# Altium footprint library WR-TBL_Pluggable PCB Header.PcbLib: 719 footprints (part 36 of 45)
Each footprint in its own frame and in the unit in brackets; x right, y up, seen from the top. Pads: shape width x height; smd on the part's side, far side on the other; paste and mask are expansions set on the pad; w line width, h text height; cw(c..) or ccw(c..) is an arc to the next point about the centre after c.
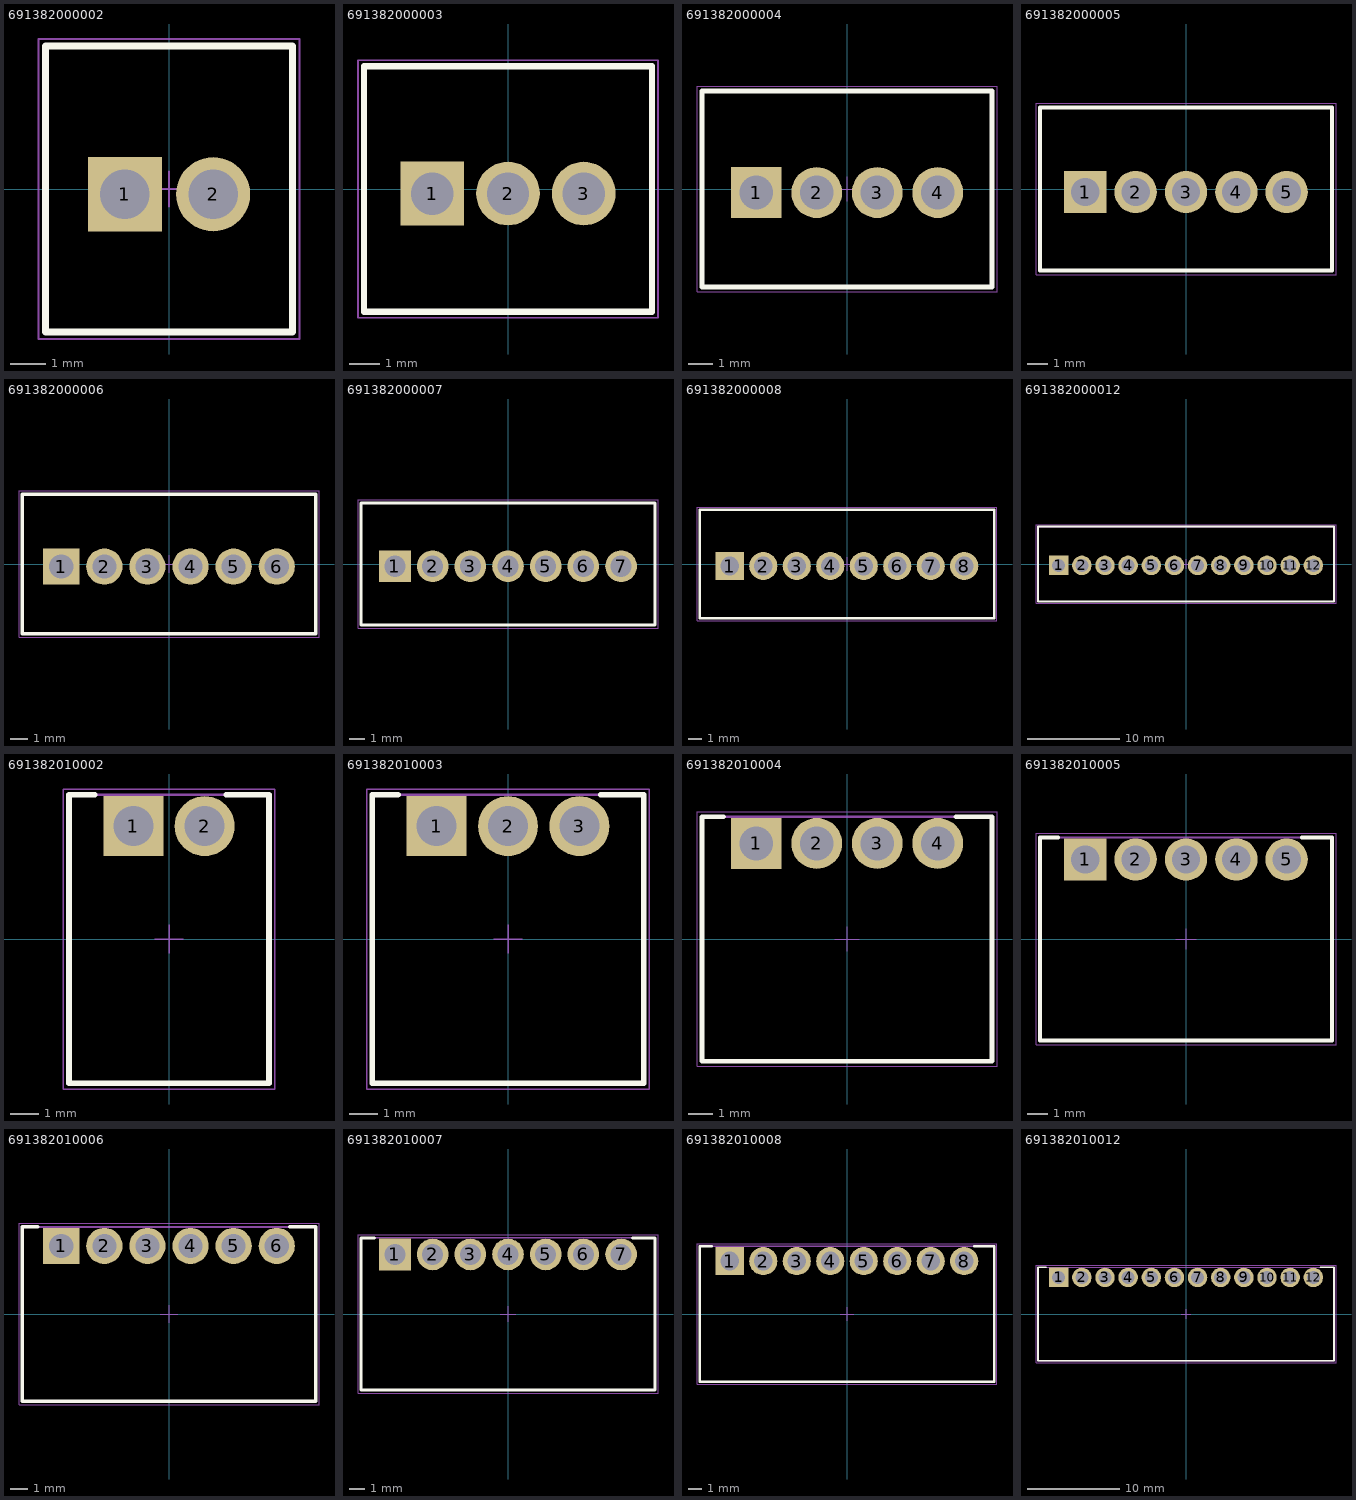
[diagram p35: the footprints below, top view; thin cyan lines are the x and y axes]

## 691382000002 [mm] "Vertical PCB Header, pitch 2.5mm, 02p"
height 10.1
pads (2):
  rect 2.1x2.1 hole 1.4: 1(-1.25,-0.15)
  round 2.1 hole 1.4: 2(1.25,-0.15)
Top Overlay:
  lines w0.2: -3.5,-4.05 3.5,-4.05 3.5,4.05 -3.5,4.05 -3.5,-4.05
Mechanical 13:
  lines w0.1: -3.5,-4.05 -3.5,4.05 3.5,4.05 3.5,-4.05 -3.5,-4.05
Mechanical 15:
  lines w0.05: -0.5,0 0.5,0 ; 0,-0.5 0,0.5 ; -3.7,-4.25 3.7,-4.25 3.7,4.25 -3.7,4.25 -3.7,-4.25
3D body "691382000002.stp": height 10.14, standoff -3.46, extent -3.5,-4.05 3.5,4.05

## 691382000003 [mm] "Vertical PCB Header, pitch 2.5mm, 03p"
height 10.1
pads (3):
  rect 2.1x2.1 hole 1.4: 1(-2.5,-0.15)
  round 2.1 hole 1.4: 2(0,-0.15) 3(2.5,-0.15)
Top Overlay:
  lines w0.2: -4.75,-4.05 -4.75,4.05 4.75,4.05 4.75,-4.05 -4.75,-4.05
Mechanical 13:
  lines w0.1: -4.75,-4.05 4.75,-4.05 4.75,4.05 -4.75,4.05 -4.75,-4.05
Mechanical 15:
  lines w0.05: -0.5,0 0.5,0 ; 0,-0.5 0,0.5 ; -4.95,-4.25 -4.95,4.25 4.95,4.25 4.95,-4.25 -4.95,-4.25
3D body "691382000003.stp": height 10.14, standoff -3.46, extent -4.75,-4.05 4.75,4.05

## 691382000004 [mm] "Vertical PCB Header, pitch 2.5mm, 04p"
height 10.1
pads (4):
  rect 2.1x2.1 hole 1.4: 1(-3.75,-0.15)
  round 2.1 hole 1.4: 2(-1.25,-0.15) 3(1.25,-0.15) 4(3.75,-0.15)
Top Overlay:
  lines w0.2: -6,-4.05 6,-4.05 6,4.05 -6,4.05 -6,-4.05
Mechanical 13:
  lines w0.1: -6,-4.05 -6,4.05 6,4.05 6,-4.05 -6,-4.05
Mechanical 15:
  lines w0.05: -0.5,0 0.5,0 ; 0,-0.5 0,0.5 ; -6.2,-4.25 6.2,-4.25 6.2,4.25 -6.2,4.25 -6.2,-4.25
3D body "691382000004.stp": height 10.14, standoff -3.46, extent -6,-4.05 6,4.05

## 691382000005 [mm] "Vertical PCB Header, pitch 2.5mm, 05p"
height 10.1
pads (5):
  rect 2.1x2.1 hole 1.4: 1(-5,-0.15)
  round 2.1 hole 1.4: 2(-2.5,-0.15) 3(0,-0.15) 4(2.5,-0.15) 5(5,-0.15)
Top Overlay:
  lines w0.2: -7.25,-4.05 7.25,-4.05 7.25,4.05 -7.25,4.05 -7.25,-4.05
Mechanical 13:
  lines w0.1: -7.25,-4.05 -7.25,4.05 7.25,4.05 7.25,-4.05 -7.25,-4.05
Mechanical 15:
  lines w0.05: -0.5,0 0.5,0 ; 0,-0.5 0,0.5 ; -7.45,-4.25 7.45,-4.25 7.45,4.25 -7.45,4.25 -7.45,-4.25
3D body "691382000005.stp": height 10.14, standoff -3.46, extent -7.25,-4.05 7.25,4.05

## 691382000006 [mm] "Vertical PCB Header, pitch 2.5mm, 06p"
height 10.1
pads (6):
  rect 2.1x2.1 hole 1.4: 1(-6.25,-0.15)
  round 2.1 hole 1.4: 2(-3.75,-0.15) 3(-1.25,-0.15) 4(1.25,-0.15) 5(3.75,-0.15) 6(6.25,-0.15)
Top Overlay:
  lines w0.2: -8.5,-4.05 -8.5,4.05 8.5,4.05 8.5,-4.05 -8.5,-4.05
Mechanical 13:
  lines w0.1: -8.5,-4.05 8.5,-4.05 8.5,4.05 -8.5,4.05 -8.5,-4.05
Mechanical 15:
  lines w0.05: -0.5,0 0.5,0 ; 0,-0.5 0,0.5 ; -8.7,-4.25 -8.7,4.25 8.7,4.25 8.7,-4.25 -8.7,-4.25
3D body "691382000006.stp": height 10.14, standoff -3.46, extent -8.5,-4.05 8.5,4.05

## 691382000007 [mm] "Vertical PCB Header, pitch 2.5mm, 07p"
height 10.1
pads (7):
  rect 2.1x2.1 hole 1.4: 1(-7.5,-0.15)
  round 2.1 hole 1.4: 2(-5,-0.15) 3(-2.5,-0.15) 4(0,-0.15) 5(2.5,-0.15) 6(5,-0.15) 7(7.5,-0.15)
Top Overlay:
  lines w0.2: -9.75,-4.05 9.75,-4.05 9.75,4.05 -9.75,4.05 -9.75,-4.05
Mechanical 13:
  lines w0.1: -9.75,-4.05 -9.75,4.05 9.75,4.05 9.75,-4.05 -9.75,-4.05
Mechanical 15:
  lines w0.05: -0.5,0 0.5,0 ; 0,-0.5 0,0.5 ; -9.95,-4.25 9.95,-4.25 9.95,4.25 -9.95,4.25 -9.95,-4.25
3D body "691382000007.stp": height 10.14, standoff -3.46, extent -9.75,-4.05 9.75,4.05

## 691382000008 [mm] "Vertical PCB Header, pitch 2.5mm, 08p"
height 10.1
pads (8):
  rect 2.1x2.1 hole 1.4: 1(-8.75,-0.15)
  round 2.1 hole 1.4: 2(-6.25,-0.15) 3(-3.75,-0.15) 4(-1.25,-0.15) 5(1.25,-0.15) 6(3.75,-0.15) 7(6.25,-0.15) 8(8.75,-0.15)
Top Overlay:
  lines w0.2: -11,-4.05 -11,4.05 11,4.05 11,-4.05 -11,-4.05
Mechanical 13:
  lines w0.1: -11,-4.05 11,-4.05 11,4.05 -11,4.05 -11,-4.05
Mechanical 15:
  lines w0.05: -0.5,0 0.5,0 ; 0,-0.5 0,0.5 ; -11.2,-4.25 -11.2,4.25 11.2,4.25 11.2,-4.25 -11.2,-4.25
3D body "691382000008.stp": height 10.14, standoff -3.46, extent -11,-4.05 11,4.05

## 691382000012 [mm] "Vertical PCB Header, pitch 2.5mm, 12p"
height 10.1
pads (12):
  rect 2.1x2.1 hole 1.4: 1(-13.75,-0.15)
  round 2.1 hole 1.4: 2(-11.25,-0.15) 3(-8.75,-0.15) 4(-6.25,-0.15) 5(-3.75,-0.15) 6(-1.25,-0.15) 7(1.25,-0.15) 8(3.75,-0.15) 9(6.25,-0.15) 10(8.75,-0.15) 11(11.25,-0.15) 12(13.75,-0.15)
Top Overlay:
  lines w0.2: -16,-4.05 16,-4.05 16,4.05 -16,4.05 -16,-4.05
Mechanical 13:
  lines w0.1: -16,-4.05 -16,4.05 16,4.05 16,-4.05 -16,-4.05
Mechanical 15:
  lines w0.05: -0.5,0 0.5,0 ; 0,-0.5 0,0.5 ; -16.2,-4.25 16.2,-4.25 16.2,4.25 -16.2,4.25 -16.2,-4.25
3D body "691382000012.stp": height 10.14, standoff -3.46, extent -16,-4.05 16,4.05

## 691382010002 [mm] "Horizontal PCB Header, pitch 2.5mm, 02p"
height 8.1
pads (2):
  rect 2.1x2.1 hole 1.4: 1(-1.25,3.95)
  round 2.1 hole 1.4: 2(1.25,3.95)
Top Overlay:
  lines w0.2: -2.6,5.05 -3.5,5.05 -3.5,-5.05 3.5,-5.05 3.5,5.05 2,5.05
Mechanical 13:
  lines w0.1: -3.5,-5.05 3.5,-5.05 3.5,5.05 -3.5,5.05 -3.5,-5.05
Mechanical 15:
  lines w0.05: -0.5,0 0.5,0 ; 0,-0.5 0,0.5 ; -3.7,-5.25 3.7,-5.25 3.7,5.25 -3.7,5.25 -3.7,-5.25
3D body "691382010002.stp": height 8.15, standoff -3.45, extent -3.5,-5.05 3.5,5.05

## 691382010003 [mm] "Horizontal PCB Header, pitch 2.5mm, 03p"
height 8.1
pads (3):
  rect 2.1x2.1 hole 1.4: 1(-2.5,3.95)
  round 2.1 hole 1.4: 2(0,3.95) 3(2.5,3.95)
Top Overlay:
  lines w0.2: -3.85,5.05 -4.75,5.05 -4.75,-5.05 4.75,-5.05 4.75,5.05 3.25,5.05
Mechanical 13:
  lines w0.1: -4.75,-5.05 4.75,-5.05 4.75,5.05 -4.75,5.05 -4.75,-5.05
Mechanical 15:
  lines w0.05: -0.5,0 0.5,0 ; 0,-0.5 0,0.5 ; -4.95,-5.25 4.95,-5.25 4.95,5.25 -4.95,5.25 -4.95,-5.25
3D body "691382010003.stp": height 8.15, standoff -3.45, extent -4.75,-5.05 4.75,5.05

## 691382010004 [mm] "Horizontal PCB Header, pitch 2.5mm, 04p"
height 8.1
pads (4):
  rect 2.1x2.1 hole 1.4: 1(-3.75,3.95)
  round 2.1 hole 1.4: 2(-1.25,3.95) 3(1.25,3.95) 4(3.75,3.95)
Top Overlay:
  lines w0.2: -5.1,5.05 -6,5.05 -6,-5.05 6,-5.05 6,5.05 4.5,5.05
Mechanical 13:
  lines w0.1: -6,-5.05 6,-5.05 6,5.05 -6,5.05 -6,-5.05
Mechanical 15:
  lines w0.05: -0.5,0 0.5,0 ; 0,-0.5 0,0.5 ; -6.2,-5.25 6.2,-5.25 6.2,5.25 -6.2,5.25 -6.2,-5.25
3D body "691382010004.stp": height 8.15, standoff -3.45, extent -6,-5.05 6,5.05

## 691382010005 [mm] "Horizontal PCB Header, pitch 2.5mm, 05p"
height 8.1
pads (5):
  rect 2.1x2.1 hole 1.4: 1(-5,3.95)
  round 2.1 hole 1.4: 2(-2.5,3.95) 3(0,3.95) 4(2.5,3.95) 5(5,3.95)
Top Overlay:
  lines w0.2: -6.35,5.05 -7.25,5.05 -7.25,-5.05 7.25,-5.05 7.25,5.05 5.75,5.05
Mechanical 13:
  lines w0.1: -7.25,-5.05 7.25,-5.05 7.25,5.05 -7.25,5.05 -7.25,-5.05
Mechanical 15:
  lines w0.05: -0.5,0 0.5,0 ; 0,-0.5 0,0.5 ; -7.45,-5.25 7.45,-5.25 7.45,5.25 -7.45,5.25 -7.45,-5.25
3D body "691382010005.stp": height 8.15, standoff -3.45, extent -7.25,-5.05 7.25,5.05

## 691382010006 [mm] "Horizontal PCB Header, pitch 2.5mm, 06p"
height 8.1
pads (6):
  rect 2.1x2.1 hole 1.4: 1(-6.25,3.95)
  round 2.1 hole 1.4: 2(-3.75,3.95) 3(-1.25,3.95) 4(1.25,3.95) 5(3.75,3.95) 6(6.25,3.95)
Top Overlay:
  lines w0.2: -7.6,5.05 -8.5,5.05 -8.5,-5.05 8.5,-5.05 8.5,5.05 7,5.05
Mechanical 13:
  lines w0.1: -8.5,-5.05 8.5,-5.05 8.5,5.05 -8.5,5.05 -8.5,-5.05
Mechanical 15:
  lines w0.05: -0.5,0 0.5,0 ; 0,-0.5 0,0.5 ; -8.7,-5.25 8.7,-5.25 8.7,5.25 -8.7,5.25 -8.7,-5.25
3D body "691382010006.stp": height 8.15, standoff -3.45, extent -8.5,-5.05 8.5,5.05

## 691382010007 [mm] "Horizontal PCB Header, pitch 2.5mm, 07p"
height 8.1
pads (7):
  rect 2.1x2.1 hole 1.4: 1(-7.5,3.95)
  round 2.1 hole 1.4: 2(-5,3.95) 3(-2.5,3.95) 4(0,3.95) 5(2.5,3.95) 6(5,3.95) 7(7.5,3.95)
Top Overlay:
  lines w0.2: -8.85,5.05 -9.75,5.05 -9.75,-5.05 9.75,-5.05 9.75,5.05 8.25,5.05
Mechanical 13:
  lines w0.1: -9.75,-5.05 -9.75,5.05 9.75,5.05 9.75,-5.05 -9.75,-5.05
Mechanical 15:
  lines w0.05: -0.5,0 0.5,0 ; 0,-0.5 0,0.5 ; -9.95,-5.25 -9.95,5.25 9.95,5.25 9.95,-5.25 -9.95,-5.25
3D body "691382010007.stp": height 8.15, standoff -3.45, extent -9.75,-5.05 9.75,5.05

## 691382010008 [mm] "Horizontal PCB Header, pitch 2.5mm, 08p"
height 8.1
pads (8):
  rect 2.1x2.1 hole 1.4: 1(-8.75,3.95)
  round 2.1 hole 1.4: 2(-6.25,3.95) 3(-3.75,3.95) 4(-1.25,3.95) 5(1.25,3.95) 6(3.75,3.95) 7(6.25,3.95) 8(8.75,3.95)
Top Overlay:
  lines w0.2: -10.1,5.05 -11,5.05 -11,-5.05 11,-5.05 11,5.05 9.5,5.05
Mechanical 13:
  lines w0.1: -11,-5.05 11,-5.05 11,5.05 -11,5.05 -11,-5.05
Mechanical 15:
  lines w0.05: -0.5,0 0.5,0 ; 0,-0.5 0,0.5 ; -11.2,-5.25 11.2,-5.25 11.2,5.25 -11.2,5.25 -11.2,-5.25
3D body "691382010008.stp": height 8.15, standoff -3.45, extent -11,-5.05 11,5.05

## 691382010012 [mm] "Horizontal PCB Header, pitch 2.5mm, 12p"
height 8.1
pads (12):
  rect 2.1x2.1 hole 1.4: 1(-13.75,3.95)
  round 2.1 hole 1.4: 2(-11.25,3.95) 3(-8.75,3.95) 4(-6.25,3.95) 5(-3.75,3.95) 6(-1.25,3.95) 7(1.25,3.95) 8(3.75,3.95) 9(6.25,3.95) 10(8.75,3.95) 11(11.25,3.95) 12(13.75,3.95)
Top Overlay:
  lines w0.2: -15.1,5.05 -16,5.05 -16,-5.05 16,-5.05 16,5.05 14.5,5.05
Mechanical 13:
  lines w0.1: -16,-5.05 -16,5.05 16,5.05 16,-5.05 -16,-5.05
Mechanical 15:
  lines w0.05: -0.5,0 0.5,0 ; 0,-0.5 0,0.5 ; -16.2,-5.25 -16.2,5.25 16.2,5.25 16.2,-5.25 -16.2,-5.25
3D body "691382010012.stp": height 8.15, standoff -3.45, extent -16,-5.05 16,5.05